# Altium footprint library Connectors.PcbLib: 135 footprints (part 7 of 9)
Each footprint in its own frame and in the unit in brackets; x right, y up, seen from the top. Pads: shape width x height; smd on the part's side, far side on the other; paste and mask are expansions set on the pad; w line width, h text height; cw(c..) or ccw(c..) is an arc to the next point about the centre after c.
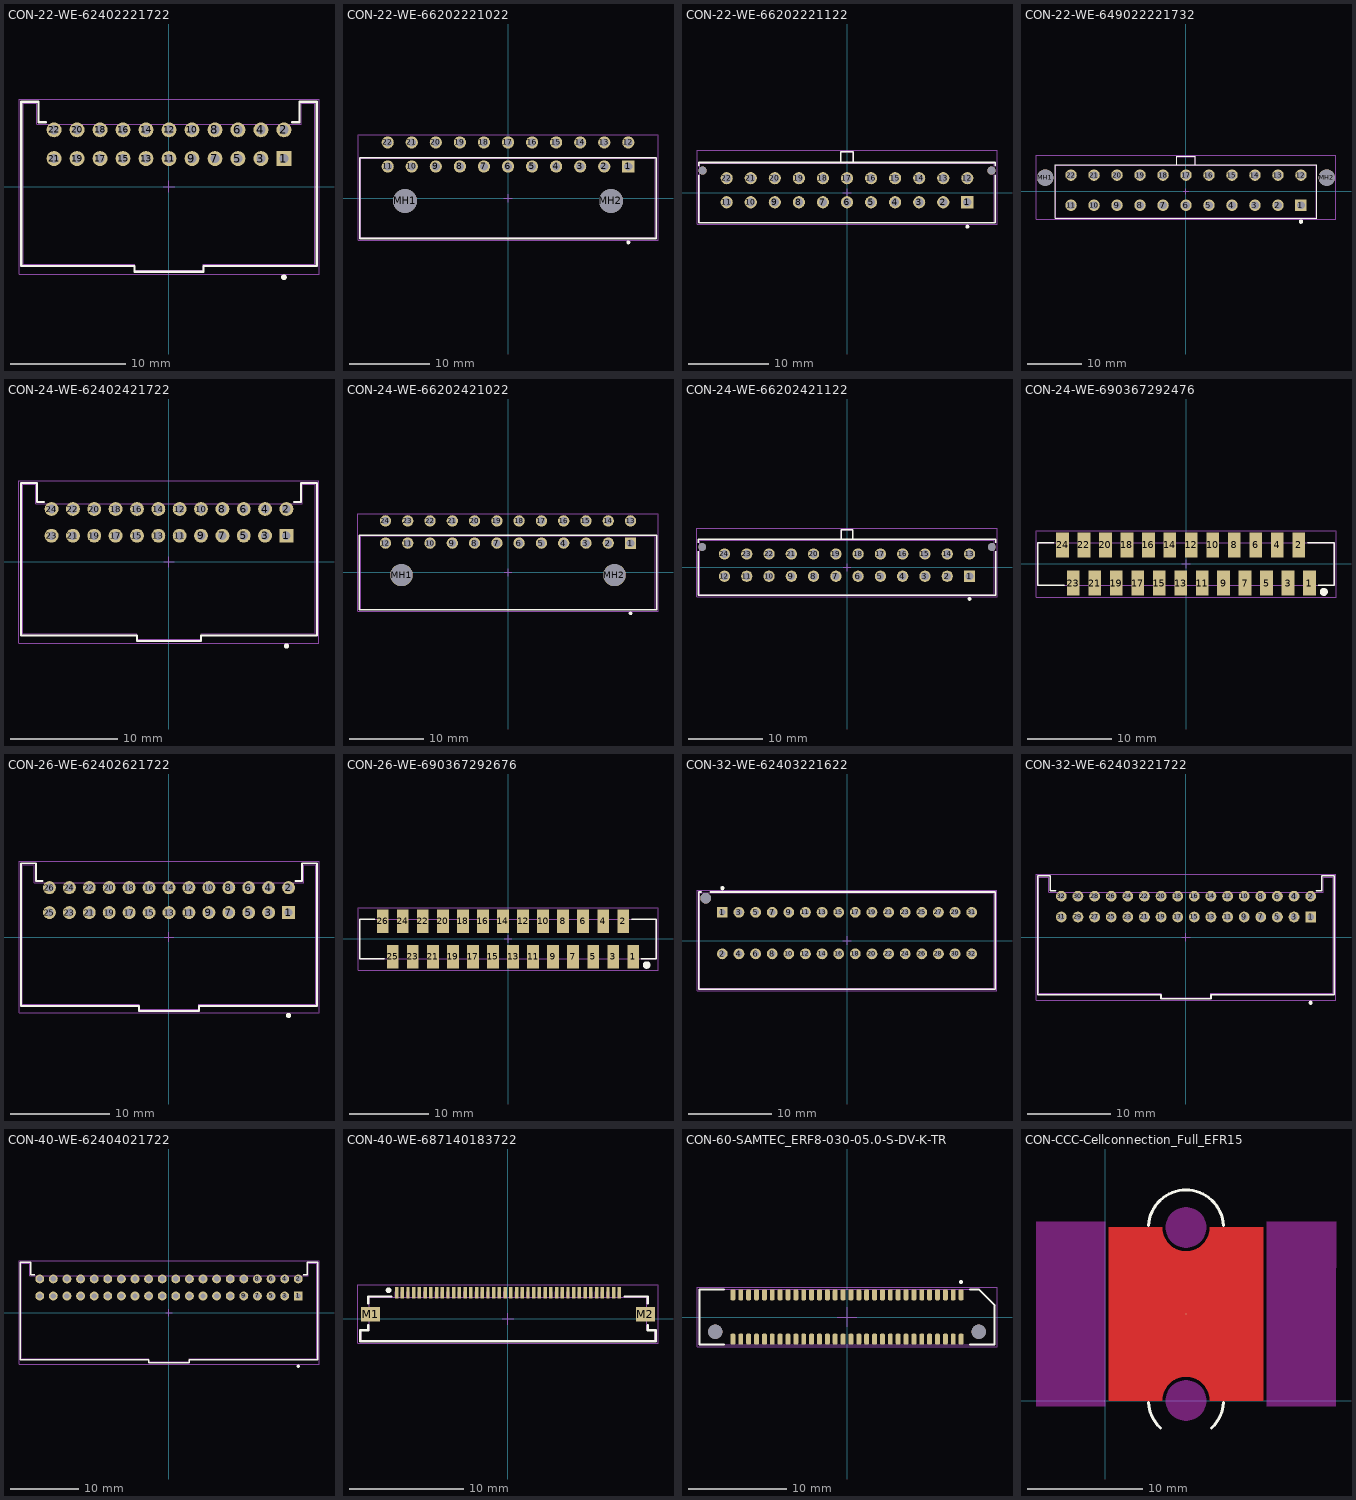
[diagram p6: the footprints below, top view; thin cyan lines are the x and y axes]

## CON-22-WE-62402221722 [mm] "2.00mm Male Dual Row Horizontal Shrouded Header with positive locking, 22p"
height 11.7
pads (22):
  rect 1.3x1.3 hole 0.8: 1(10,2.45)
  round 1.3 hole 0.8: 2(10,4.95) 3(8,2.45) 4(8,4.95) 5(6,2.45) 6(6,4.95) 7(4,2.45) 8(4,4.95) 9(2,2.45) 10(2,4.95) 11(0,2.45) 12(0,4.95) 13(-2,2.45) 14(-2,4.95) 15(-4,2.45) 16(-4,4.95) 17(-6,2.45) 18(-6,4.95) 19(-8,2.45) 20(-8,4.95) 21(-10,2.45) 22(-10,4.95)
Top Overlay:
  circle w0.25: c10,-7.875 r0.125
  lines w0.2: -10.7,5.6 -11.35,5.6 -11.35,7.4 -12.85,7.4 -12.85,-6.9 -3,-6.9 -3,-7.4 3,-7.4 3,-6.9 12.85,-6.9 12.85,7.4 11.35,7.4 11.35,5.6 10.7,5.6
Top Component Center:
  lines w0.05: -0.5,0 0.5,0 ; 0,-0.5 0,0.5
Top Component Outline:
  lines w0.1: -12.7,-6.75 -3,-6.75 -3,-7.25 3,-7.25 3,-6.75 12.7,-6.75 12.7,7.25 11.5,7.25 11.5,5.45 -11.5,5.45 -11.5,7.25 -12.7,7.25 -12.7,-6.75
Top Courtyard (Mech26):
  lines w0.05: -13.05,-7.6 -13.05,7.6 13.05,7.6 13.05,-7.6 -13.05,-7.6
3D body "62402221722.stp": height 11.73, standoff -3.17, extent -12.7,-7.25 12.7,7.25

## CON-22-WE-66202221022 [mm] "Dual row Right angle header With plastic peg 22p"
height 8.76
pads (24):
  rect 1.52x1.52 hole 1.02: 1(15,3.95)
  round 1.52 hole 1.02: 2(12,3.95) 3(9,3.95) 4(6,3.95) 5(3,3.95) 6(0,3.95) 7(-3,3.95) 8(-6,3.95) 9(-9,3.95) 10(-12,3.95) 11(-15,3.95) 12(15,6.95) 13(12,6.95) 14(9,6.95) 15(6,6.95) 16(3,6.95) 17(0,6.95) 18(-3,6.95) 19(-6,6.95) 20(-9,6.95) 21(-12,6.95) 22(-15,6.95)
  round 3 hole 3 unplated: MH1(-12.84,-0.35) MH2(12.84,-0.35)
Top Overlay:
  circle w0.25: c15,-5.5 r0.125
  lines w0.2: -18.5,-5.025 -18.5,5.025 18.5,5.025 18.5,-5.025 -18.5,-5.025
Top Component Center:
  lines w0.05: -0.5,0 0.5,0 ; 0,-0.5 0,0.5 ; -18.7,-5.225 18.7,-5.225 18.7,7.91 -18.7,7.91 -18.7,-5.225
Top Component Outline:
  lines w0.1: -18.35,-4.95 -18.35,4.95 18.35,4.95 18.35,-4.95 -18.35,-4.95
3D body "62002221022.stp": height 8.79, standoff -3.17, extent -18.35,-4.95 18.35,7.27

## CON-22-WE-66202221122 [mm] "Dual row Vertical header 22p"
height 9.9
pads (24):
  rect 1.52x1.52 hole 1.02: 1(15,-1.2)
  round 1.52 hole 1.02: 2(12,-1.2) 3(9,-1.2) 4(6,-1.2) 5(3,-1.2) 6(0,-1.2) 7(-3,-1.2) 8(-6,-1.2) 9(-9,-1.2) 10(-12,-1.2) 11(-15,-1.2) 12(15,1.8) 13(12,1.8) 14(9,1.8) 15(6,1.8) 16(3,1.8) 17(0,1.8) 18(-3,1.8) 19(-6,1.8) 20(-9,1.8) 21(-12,1.8) 22(-15,1.8)
  round 1.02 hole 1.02 unplated: MH1(-18,2.74) MH2(18,2.74)
Top Overlay:
  circle w0.25: c15,-4.25 r0.125
  lines w0.2: -18.5,2.145 -18.5,-3.755 18.5,-3.755 18.5,2.145 ; -18.5,3.345 -18.5,3.755 18.5,3.755 18.5,3.345 ; -0.8,3.755 -0.8,5.08 0.8,5.08 0.8,3.755
Top Component Center:
  lines w0.05: -0.5,0 0.5,0 ; 0,-0.5 0,0.5
Top Component Outline:
  lines w0.1: -0.8,3.68 -0.8,5.08 0.8,5.08 0.8,3.68 ; -18.35,-3.68 18.35,-3.68 18.35,3.68 -18.35,3.68 -18.35,-3.68
Top Courtyard (Mech26):
  lines w0.05: -18.7,-3.955 -18.7,5.28 18.7,5.28 18.7,-3.955 -18.7,-3.955
3D body "66202221122.stp": height 9.93, standoff -3.17, extent -18.35,-3.68 18.35,5.08

## CON-22-WE-649022221732 [mm] "4.20mm Male Dual Row Vertical Header with Mounting Pegs, 22p"
height 12.8
pads (24):
  rect 2.1x2.1 hole 1.4: 1(21,-2.51)
  round 2.1 hole 1.4: 2(16.8,-2.51) 3(12.6,-2.51) 4(8.4,-2.51) 5(4.2,-2.51) 6(0,-2.51) 7(-4.2,-2.51) 8(-8.4,-2.51) 9(-12.6,-2.51) 10(-16.8,-2.51) 11(-21,-2.51) 12(21,2.99) 13(16.8,2.99) 14(12.6,2.99) 15(8.4,2.99) 16(4.2,2.99) 17(0,2.99) 18(-4.2,2.99) 19(-8.4,2.99) 20(-12.6,2.99) 21(-16.8,2.99) 22(-21,2.99)
  round 3 hole 3 unplated: MH1(-25.7,2.53) MH2(25.7,2.53)
Top Overlay:
  circle w0.4: c21,-5.5 r0.2
  lines w0.2: -1.7,4.94 -1.7,6.4 1.7,6.4 1.7,4.94 ; -23.875,-4.9 -23.875,4.9 23.875,4.9 23.875,-4.9 -23.875,-4.9
Top Component Center:
  lines w0.05: -0.5,0 0.5,0 ; 0,-0.5 0,0.5
Top Component Outline:
  lines w0.1: -1.7,4.84 -1.7,6.3 1.7,6.3 1.7,4.84 ; -23.75,-4.8 23.75,-4.8 23.75,4.8 -23.75,4.8 -23.75,-4.8
Top Courtyard (Mech26):
  lines w0.05: -27.4,-5.1 27.4,-5.1 27.4,6.6 -27.4,6.6 -27.4,-5.1
3D body "649022221732.stp": height 12.84, standoff -3.46, extent -26.7,-4.8 26.7,6.3

## CON-24-WE-62402421722 [mm] "2.00mm Male Dual Row Horizontal Shrouded Header with positive locking, 24p"
height 11.7
pads (24):
  rect 1.3x1.3 hole 0.8: 1(11,2.45)
  round 1.3 hole 0.8: 2(11,4.95) 3(9,2.45) 4(9,4.95) 5(7,2.45) 6(7,4.95) 7(5,2.45) 8(5,4.95) 9(3,2.45) 10(3,4.95) 11(1,2.45) 12(1,4.95) 13(-1,2.45) 14(-1,4.95) 15(-3,2.45) 16(-3,4.95) 17(-5,2.45) 18(-5,4.95) 19(-7,2.45) 20(-7,4.95) 21(-9,2.45) 22(-9,4.95) 23(-11,2.45) 24(-11,4.95)
Top Overlay:
  circle w0.25: c11,-7.875 r0.125
  lines w0.2: -11.7,5.6 -12.35,5.6 -12.35,7.4 -13.85,7.4 -13.85,-6.9 -3,-6.9 -3,-7.4 3,-7.4 3,-6.9 13.85,-6.9 13.85,7.4 12.35,7.4 12.35,5.6 11.7,5.6
Top Component Center:
  lines w0.05: -0.5,0 0.5,0 ; 0,-0.5 0,0.5
Top Component Outline:
  lines w0.1: -13.7,-6.75 -13.7,7.25 -12.5,7.25 -12.5,5.45 12.5,5.45 12.5,7.25 13.7,7.25 13.7,-6.75 3,-6.75 3,-7.25 -3,-7.25 -3,-6.75 -13.7,-6.75
Top Courtyard (Mech26):
  lines w0.05: -14.05,-7.6 -14.05,7.6 14.05,7.6 14.05,-7.6 -14.05,-7.6
3D body "62402421722.stp": height 11.73, standoff -3.17, extent -13.7,-7.25 13.7,7.25

## CON-24-WE-66202421022 [mm] "Dual row Right angle header With plastic peg 24p"
height 8.76
pads (26):
  rect 1.52x1.52 hole 1.02: 1(16.5,3.95)
  round 1.52 hole 1.02: 2(13.5,3.95) 3(10.5,3.95) 4(7.5,3.95) 5(4.5,3.95) 6(1.5,3.95) 7(-1.5,3.95) 8(-4.5,3.95) 9(-7.5,3.95) 10(-10.5,3.95) 11(-13.5,3.95) 12(-16.5,3.95) 13(16.5,6.95) 14(13.5,6.95) 15(10.5,6.95) 16(7.5,6.95) 17(4.5,6.95) 18(1.5,6.95) 19(-1.5,6.95) 20(-4.5,6.95) 21(-7.5,6.95) 22(-10.5,6.95) 23(-13.5,6.95) 24(-16.5,6.95)
  round 3 hole 3 unplated: MH1(-14.34,-0.35) MH2(14.34,-0.35)
Top Overlay:
  circle w0.25: c16.5,-5.5 r0.125
  lines w0.2: -20,-5.025 20,-5.025 20,5.025 -20,5.025 -20,-5.025
Top Component Center:
  lines w0.05: -0.5,0 0.5,0 ; 0,-0.5 0,0.5
Top Component Outline:
  lines w0.1: -19.85,-4.95 -19.85,4.95 19.85,4.95 19.85,-4.95 -19.85,-4.95
Top Courtyard (Mech26):
  lines w0.05: -20.2,-5.225 -20.2,7.91 20.2,7.91 20.2,-5.225 -20.2,-5.225
3D body "62002421022.stp": height 8.79, standoff -3.17, extent -19.85,-4.95 19.85,7.27

## CON-24-WE-66202421122 [mm] "Dual row Vertical header 26p"
height 9.9
pads (26):
  rect 1.52x1.52 hole 1.02: 1(16.5,-1.2)
  round 1.52 hole 1.02: 2(13.5,-1.2) 3(10.5,-1.2) 4(7.5,-1.2) 5(4.5,-1.2) 6(1.5,-1.2) 7(-1.5,-1.2) 8(-4.5,-1.2) 9(-7.5,-1.2) 10(-10.5,-1.2) 11(-13.5,-1.2) 12(-16.5,-1.2) 13(16.5,1.8) 14(13.5,1.8) 15(10.5,1.8) 16(7.5,1.8) 17(4.5,1.8) 18(1.5,1.8) 19(-1.5,1.8) 20(-4.5,1.8) 21(-7.5,1.8) 22(-10.5,1.8) 23(-13.5,1.8) 24(-16.5,1.8)
  round 1.02 hole 1.02 unplated: MH1(-19.5,2.74) MH2(19.5,2.74)
Top Overlay:
  circle w0.25: c16.5,-4.25 r0.125
  lines w0.2: -20,2.145 -20,-3.755 20,-3.755 20,2.145 ; -20,3.345 -20,3.755 20,3.755 20,3.345 ; -0.8,3.755 -0.8,5.08 0.8,5.08 0.8,3.755
Top Component Center:
  lines w0.05: -0.5,0 0.5,0 ; 0,-0.5 0,0.5
Top Component Outline:
  lines w0.1: -0.8,3.68 -0.8,5.08 0.8,5.08 0.8,3.68 ; -19.85,-3.68 19.85,-3.68 19.85,3.68 -19.85,3.68 -19.85,-3.68
Top Courtyard (Mech26):
  lines w0.05: -20.2,-3.955 -20.2,5.28 20.2,5.28 20.2,-3.955 -20.2,-3.955
3D body "66202421122.stp": height 9.93, standoff -3.17, extent -19.85,-3.68 19.85,5.08

## CON-24-WE-690367292476 [mm] "MiniModule Connectors, PCB Type, Female, SMT, Vertical, 24p"
height 5.45
pads (24):
  rect 1.5x3 smd: 1(14.605,-2.25) 2(13.335,2.25) 3(12.065,-2.25) 4(10.795,2.25) 5(9.525,-2.25) 6(8.255,2.25) 7(6.985,-2.25) 8(5.715,2.25) 9(4.445,-2.25) 10(3.175,2.25) 11(1.905,-2.25) 12(0.635,2.25) 13(-0.635,-2.25) 14(-1.905,2.25) 15(-3.175,-2.25) 16(-4.445,2.25) 17(-5.715,-2.25) 18(-6.985,2.25) 19(-8.255,-2.25) 20(-9.525,2.25) 21(-10.795,-2.25) 22(-12.065,2.25) 23(-13.335,-2.25) 24(-14.605,2.25)
Top Overlay:
  circle w0.5: c16.3,-3.3 r0.224
  lines w0.2: -15.65,2.5 -17.54,2.5 -17.54,-2.5 -14.4,-2.5 ; 14.4,2.5 17.54,2.5 17.54,-2.5 15.65,-2.5
Top Component Center:
  lines w0.05: -0.5,0 0.5,0 ; 0,-0.5 0,0.5
Top Component Outline:
  lines w0.1: -17.54,-2.5 17.54,-2.5 17.54,2.5 -17.54,2.5 -17.54,-2.5
Top Courtyard (Mech26):
  lines w0.05: -17.74,-3.95 -17.74,3.95 17.74,3.95 17.74,-3.95 -17.74,-3.95
3D body "690367292476.stp": height 5.75, standoff 0, extent -17.535,-3.498 17.535,3.499

## CON-26-WE-62402621722 [mm] "2.00mm Male Dual Row Horizontal Shrouded Header with positive locking, 26p"
height 11.7
pads (26):
  rect 1.3x1.3 hole 0.8: 1(12,2.45)
  round 1.3 hole 0.8: 2(12,4.95) 3(10,2.45) 4(10,4.95) 5(8,2.45) 6(8,4.95) 7(6,2.45) 8(6,4.95) 9(4,2.45) 10(4,4.95) 11(2,2.45) 12(2,4.95) 13(0,2.45) 14(0,4.95) 15(-2,2.45) 16(-2,4.95) 17(-4,2.45) 18(-4,4.95) 19(-6,2.45) 20(-6,4.95) 21(-8,2.45) 22(-8,4.95) 23(-10,2.45) 24(-10,4.95) 25(-12,2.45) 26(-12,4.95)
Top Overlay:
  circle w0.25: c12,-7.875 r0.125
  lines w0.2: -12.7,5.6 -13.35,5.6 -13.35,7.4 -14.85,7.4 -14.85,-6.9 -3,-6.9 -3,-7.4 3,-7.4 3,-6.9 14.85,-6.9 14.85,7.4 13.35,7.4 13.35,5.6 12.7,5.6
Top Component Center:
  lines w0.05: -0.5,0 0.5,0 ; 0,-0.5 0,0.5
Top Component Outline:
  lines w0.1: -14.7,-6.75 -3,-6.75 -3,-7.25 3,-7.25 3,-6.75 14.7,-6.75 14.7,7.25 13.5,7.25 13.5,5.45 -13.5,5.45 -13.5,7.25 -14.7,7.25 -14.7,-6.75
Top Courtyard (Mech26):
  lines w0.05: -15.05,-7.6 15.05,-7.6 15.05,7.6 -15.05,7.6 -15.05,-7.6
3D body "62402621722.stp": height 11.73, standoff -3.17, extent -14.7,-7.25 14.7,7.25

## CON-26-WE-690367292676 [mm] "MiniModule Connectors, PCB Type, Female, SMT, Vertical, 26p"
height 5.45
pads (26):
  rect 1.5x3 smd: 1(15.875,-2.25) 2(14.605,2.25) 3(13.335,-2.25) 4(12.065,2.25) 5(10.795,-2.25) 6(9.525,2.25) 7(8.255,-2.25) 8(6.985,2.25) 9(5.715,-2.25) 10(4.445,2.25) 11(3.175,-2.25) 12(1.905,2.25) 13(0.635,-2.25) 14(-0.635,2.25) 15(-1.905,-2.25) 16(-3.175,2.25) 17(-4.445,-2.25) 18(-5.715,2.25) 19(-6.985,-2.25) 20(-8.255,2.25) 21(-9.525,-2.25) 22(-10.795,2.25) 23(-12.065,-2.25) 24(-13.335,2.25) 25(-14.605,-2.25) 26(-15.875,2.25)
Top Overlay:
  circle w0.5: c17.57,-3.3 r0.224
  lines w0.2: -16.92,2.5 -18.81,2.5 -18.81,-2.5 -15.67,-2.5 ; 15.67,2.5 18.81,2.5 18.81,-2.5 16.92,-2.5
Top Component Center:
  lines w0.05: -0.5,0 0.5,0 ; 0,-0.5 0,0.5
Top Component Outline:
  lines w0.1: -18.81,-2.5 18.81,-2.5 18.81,2.5 -18.81,2.5 -18.81,-2.5
Top Courtyard (Mech26):
  lines w0.05: -19.01,-3.95 -19.01,3.95 19.01,3.95 19.01,-3.95 -19.01,-3.95
3D body "690367292676.stp": height 5.75, standoff 0, extent -18.805,-3.498 18.805,3.499

## CON-32-WE-62403221622 [mm] "2.00mm Male Dual Row Vertical Shrouded Header with positive locking, 32p"
height 11.6
pads (33):
  rect 1.3x1.3 hole 0.8: 1(-15,3.4)
  round 1.3 hole 0.8: 2(-15,-1.6) 3(-13,3.4) 4(-13,-1.6) 5(-11,3.4) 6(-11,-1.6) 7(-9,3.4) 8(-9,-1.6) 9(-7,3.4) 10(-7,-1.6) 11(-5,3.4) 12(-5,-1.6) 13(-3,3.4) 14(-3,-1.6) 15(-1,3.4) 16(-1,-1.6) 17(1,3.4) 18(1,-1.6) 19(3,3.4) 20(3,-1.6) 21(5,3.4) 22(5,-1.6) 23(7,3.4) 24(7,-1.6) 25(9,3.4) 26(9,-1.6) 27(11,3.4) 28(11,-1.6) 29(13,3.4) 30(13,-1.6) 31(15,3.4) 32(15,-1.6)
  round 1.3 hole 1.3 unplated: MH1(-17,5.1)
Top Overlay:
  circle w0.25: c-15,6.3 r0.125
  lines w0.2: -17.55,5.85 -17.85,5.85 -17.85,-5.85 17.85,-5.85 17.85,5.85 -16.45,5.85
Top Component Center:
  lines w0.05: -0.5,0 0.5,0 ; 0,-0.5 0,0.5
Top Component Outline:
  lines w0.1: -17.7,-5.75 17.7,-5.75 17.7,5.75 -17.7,5.75 ; -17.7,-5.75 -17.7,5.75 ; -17.7,-5.75 -17.7,5.75
Top Courtyard (Mech26):
  lines w0.05: -18.05,-6.05 -18.05,6.05 18.05,6.05 18.05,-6.05 -18.05,-6.05
3D body "62403221622.stp": height 9.78, standoff -3.17, extent -17.7,-5.75 17.7,5.75

## CON-32-WE-62403221722 [mm] "2.00mm Male Dual Row Horizontal Shrouded Header with positive locking, 32p"
height 11.7
pads (32):
  rect 1.3x1.3 hole 0.8: 1(15,2.45)
  round 1.3 hole 0.8: 2(15,4.95) 3(13,2.45) 4(13,4.95) 5(11,2.45) 6(11,4.95) 7(9,2.45) 8(9,4.95) 9(7,2.45) 10(7,4.95) 11(5,2.45) 12(5,4.95) 13(3,2.45) 14(3,4.95) 15(1,2.45) 16(1,4.95) 17(-1,2.45) 18(-1,4.95) 19(-3,2.45) 20(-3,4.95) 21(-5,2.45) 22(-5,4.95) 23(-7,2.45) 24(-7,4.95) 25(-9,2.45) 26(-9,4.95) 27(-11,2.45) 28(-11,4.95) 29(-13,2.45) 30(-13,4.95) 31(-15,2.45) 32(-15,4.95)
Top Overlay:
  circle w0.25: c15,-7.875 r0.125
  lines w0.2: -15.7,5.6 -16.35,5.6 -16.35,7.4 -17.85,7.4 -17.85,-6.9 -3,-6.9 -3,-7.4 3,-7.4 3,-6.9 17.85,-6.9 17.85,7.4 16.35,7.4 16.35,5.6 15.7,5.6
Top Component Center:
  lines w0.05: -0.5,0 0.5,0 ; 0,-0.5 0,0.5
Top Component Outline:
  lines w0.1: -17.7,-6.75 -17.7,7.25 -16.5,7.25 -16.5,5.45 16.5,5.45 16.5,7.25 17.7,7.25 17.7,-6.75 3,-6.75 3,-7.25 -3,-7.25 -3,-6.75 -17.7,-6.75
Top Courtyard (Mech26):
  lines w0.05: -18.05,-7.6 -18.05,7.6 18.05,7.6 18.05,-7.6 -18.05,-7.6
3D body "62403221722.stp": height 11.73, standoff -3.17, extent -17.7,-7.25 17.7,7.25

## CON-40-WE-62404021722 [mm] "2.00mm Male Dual Row Horizontal Shrouded Header with positive locking, 40p"
height 11.7
pads (40):
  rect 1.3x1.3 hole 0.8: 1(19,2.45)
  round 1.3 hole 0.8: 2(19,4.95) 3(17,2.45) 4(17,4.95) 5(15,2.45) 6(15,4.95) 7(13,2.45) 8(13,4.95) 9(11,2.45) 10(11,4.95) 11(9,2.45) 12(9,4.95) 13(7,2.45) 14(7,4.95) 15(5,2.45) 16(5,4.95) 17(3,2.45) 18(3,4.95) 19(1,2.45) 20(1,4.95) 21(-1,2.45) 22(-1,4.95) 23(-3,2.45) 24(-3,4.95) 25(-5,2.45) 26(-5,4.95) 27(-7,2.45) 28(-7,4.95) 29(-9,2.45) 30(-9,4.95) 31(-11,2.45) 32(-11,4.95) 33(-13,2.45) 34(-13,4.95) 35(-15,2.45) 36(-15,4.95) 37(-17,2.45) 38(-17,4.95) 39(-19,2.45) 40(-19,4.95)
Top Overlay:
  circle w0.25: c19,-7.875 r0.125
  lines w0.2: -19.7,5.6 -20.35,5.6 -20.35,7.4 -21.85,7.4 -21.85,-6.9 -3,-6.9 -3,-7.4 3,-7.4 3,-6.9 21.85,-6.9 21.85,7.4 20.35,7.4 20.35,5.6 19.7,5.6
Bottom Courtyard (Mech15):
  lines w0.05: -0.5,0 0.5,0 ; 0,-0.5 0,0.5
Top Component Outline:
  lines w0.1: -21.7,-6.75 -21.7,7.25 -20.5,7.25 -20.5,5.45 20.5,5.45 20.5,7.25 21.7,7.25 21.7,-6.75 3,-6.75 3,-7.25 -3,-7.25 -3,-6.75 -21.7,-6.75
Top Courtyard (Mech26):
  lines w0.05: -22.05,-7.6 -22.05,7.6 22.05,7.6 22.05,-7.6 -22.05,-7.6
3D body "62404021722.stp": height 11.73, standoff -3.17, extent -21.7,-7.25 21.7,7.25

## CON-40-WE-687140183722 [mm] "ZIF Connectors, Horizontal, Bottom Contact Low Profile, pitch 0.5mm, 40p"
height 1.3
pads (42):
  rect 0.3x1 smd mask+0: 1(-9.75,2.3) 2(-9.25,2.3) 3(-8.75,2.3) 4(-8.25,2.3) 5(-7.75,2.3) 6(-7.25,2.3) 7(-6.75,2.3) 8(-6.25,2.3) 9(-5.75,2.3) 10(-5.25,2.3) 11(-4.75,2.3) 12(-4.25,2.3) 13(-3.75,2.3) 14(-3.25,2.3) 15(-2.75,2.3) 16(-2.25,2.3) 17(-1.75,2.3) 18(-1.25,2.3) 19(-0.75,2.3) 20(-0.25,2.3) 21(0.25,2.3) 22(0.75,2.3) 23(1.25,2.3) 24(1.75,2.3) 25(2.25,2.3) 26(2.75,2.3) 27(3.25,2.3) 28(3.75,2.3) 29(4.25,2.3) 30(4.75,2.3) 31(5.25,2.3) 32(5.75,2.3) 33(6.25,2.3) 34(6.75,2.3) 35(7.25,2.3) 36(7.75,2.3) 37(8.25,2.3) 38(8.75,2.3) 39(9.25,2.3) 40(9.75,2.3)
  rect 1.65x1.3 smd mask+0: M1(-12.025,0.4) M2(12.025,0.4)
Top Overlay:
  circle w0.25: c-10.45,2.5 r0.125
  lines w0.2: -12.225,-0.55 -12.225,-1 -12.925,-1 -12.925,-1.95 12.925,-1.95 12.925,-1 12.225,-1 12.225,-0.55 ; -12.225,1.35 -12.225,1.95 -10.225,1.95 ; 10.225,1.95 12.225,1.95 12.225,1.35
Top Component Center:
  lines w0.05: -0.5,0 0.5,0 ; 0,-0.5 0,0.5
Top Component Outline:
  lines w0.1: -9.85,1.9 -9.85,2.35 -9.65,2.35 -9.65,1.9 ; -9.35,1.9 -9.35,2.35 -9.15,2.35 -9.15,1.9 ; -8.85,1.9 -8.85,2.35 -8.65,2.35 -8.65,1.9 ; -8.35,1.9 -8.35,2.35 -8.15,2.35 -8.15,1.9 ; -7.85,1.9 -7.85,2.35 -7.65,2.35 -7.65,1.9 ; -7.35,1.9 -7.35,2.35 -7.15,2.35 -7.15,1.9 ; -6.85,1.9 -6.85,2.35 -6.65,2.35 -6.65,1.9 ; -6.35,1.9 -6.35,2.35 -6.15,2.35 -6.15,1.9 ; -5.85,1.9 -5.85,2.35 -5.65,2.35 -5.65,1.9 ; -5.35,1.9 -5.35,2.35 -5.15,2.35 -5.15,1.9 ; -4.85,1.9 -4.85,2.35 -4.65,2.35 -4.65,1.9 ; -4.35,1.9 -4.35,2.35 -4.15,2.35 -4.15,1.9 ; -3.85,1.9 -3.85,2.35 -3.65,2.35 -3.65,1.9 ; -3.35,1.9 -3.35,2.35 -3.15,2.35 -3.15,1.9 ; -2.85,1.9 -2.85,2.35 -2.65,2.35 -2.65,1.9 ; -2.35,1.9 -2.35,2.35 -2.15,2.35 -2.15,1.9 ; -1.85,1.9 -1.85,2.35 -1.65,2.35 -1.65,1.9 ; -1.35,1.9 -1.35,2.35 -1.15,2.35 -1.15,1.9 ; -0.85,1.9 -0.85,2.35 -0.65,2.35 -0.65,1.9 ; -0.35,1.9 -0.35,2.35 -0.15,2.35 -0.15,1.9 ; 0.15,1.9 0.15,2.35 0.35,2.35 0.35,1.9 ; 0.65,1.9 0.65,2.35 0.85,2.35 0.85,1.9 ; 1.15,1.9 1.15,2.35 1.35,2.35 1.35,1.9 ; 1.65,1.9 1.65,2.35 1.85,2.35 1.85,1.9 ; 2.15,1.9 2.15,2.35 2.35,2.35 2.35,1.9 ; 2.65,1.9 2.65,2.35 2.85,2.35 2.85,1.9 ; 3.15,1.9 3.15,2.35 3.35,2.35 3.35,1.9 ; 3.65,1.9 3.65,2.35 3.85,2.35 3.85,1.9 ; 4.15,1.9 4.15,2.35 4.35,2.35 4.35,1.9 ; 4.65,1.9 4.65,2.35 4.85,2.35 4.85,1.9 ; 5.15,1.9 5.15,2.35 5.35,2.35 5.35,1.9 ; 5.65,1.9 5.65,2.35 5.85,2.35 5.85,1.9 ; 6.15,1.9 6.15,2.35 6.35,2.35 6.35,1.9 ; 6.65,1.9 6.65,2.35 6.85,2.35 6.85,1.9 ; 7.15,1.9 7.15,2.35 7.35,2.35 7.35,1.9 ; 7.65,1.9 7.65,2.35 7.85,2.35 7.85,1.9 ; 8.15,1.9 8.15,2.35 8.35,2.35 8.35,1.9 ; 8.65,1.9 8.65,2.35 8.85,2.35 8.85,1.9 ; 9.15,1.9 9.15,2.35 9.35,2.35 9.35,1.9 ; 9.65,1.9 9.65,2.35 9.85,2.35 9.85,1.9 ; -12.85,-1.9 -12.85,-1 -12.15,-1 -12.15,1.9 12.15,1.9 12.15,-1 12.85,-1 12.85,-1.9 -12.85,-1.9
Top Courtyard (Mech26):
  lines w0.05: -13.125,-2.15 -13.125,3 13.125,3 13.125,-2.15 -13.125,-2.15
Top Designator:
  text ".Designator" at -7.498,-0.5 h1.5
3D body "687140183722.stp": height 1.28, standoff -0.01, extent -12.85,-1.9 12.85,2.35

## CON-60-SAMTEC_ERF8-030-05.0-S-DV-K-TR [mm] "Samtec Edge Rate® ERF8-Series Rugged High Speed Socket 0.80mm"
pads (62):
  rrect50% 0.5x1.1 smd mask+0.045: 01(11.6,2.25) 02(11.6,-2.25) 03(10.8,2.25) 04(10.8,-2.25) 05(10,2.25) 06(10,-2.25) 07(9.2,2.25) 08(9.2,-2.25) 09(8.4,2.25) 10(8.4,-2.25) 11(7.6,2.25) 12(7.6,-2.25) 13(6.8,2.25) 14(6.8,-2.25) 15(6,2.25) 16(6,-2.25) 17(5.2,2.25) 18(5.2,-2.25) 19(4.4,2.25) 20(4.4,-2.25) 21(3.6,2.25) 22(3.6,-2.25) 23(2.8,2.25) 24(2.8,-2.25) 25(2,2.25) 26(2,-2.25) 27(1.2,2.25) 28(1.2,-2.25) 29(0.4,2.25) 30(0.4,-2.25) 31(-0.4,2.25) 32(-0.4,-2.25) 33(-1.2,2.25) 34(-1.2,-2.25) 35(-2,2.25) 36(-2,-2.25) 37(-2.8,2.25) 38(-2.8,-2.25) 39(-3.6,2.25) 40(-3.6,-2.25) 41(-4.4,2.25) 42(-4.4,-2.25) 43(-5.2,2.25) 44(-5.2,-2.25) 45(-6,2.25) 46(-6,-2.25) 47(-6.8,2.25) 48(-6.8,-2.25) 49(-7.6,2.25) 50(-7.6,-2.25) 51(-8.4,2.25) 52(-8.4,-2.25) 53(-9.2,2.25) 54(-9.2,-2.25) 55(-10,2.25) 56(-10,-2.25) 57(-10.8,2.25) 58(-10.8,-2.25) 59(-11.6,2.25) 60(-11.6,-2.25)
  round 1.45 hole 1.45 unplated mask+0: ""(-13.4,-1.5) ""(13.4,-1.5)
Top Overlay:
  circle w0.2: c11.6,3.56 r0.1
  lines w0.2: -12.5,-2.8 -15,-2.8 -15,2.8 -12.5,2.8 ; 12.5,-2.8 15,-2.8 15,1.2 13.4,2.8 12.5,2.8
Top Component Center:
  lines w0.1: -1,0 1,0 ; 0,-1 0,1
Top Component Outline:
  circle w0.2: c11.6,3.56 r0.1
  lines w0.1: -15,-2.8 -15,2.8 13.4,2.8 15,1.2 15,-2.8 -15,-2.8
Top Courtyard (Mech26):
  lines w0.05: -15.25,-3.05 -15.25,3.05 15.25,3.05 15.25,-3.05 -15.25,-3.05
3D body "ERF8-030-05.0-S-DV-K-TR.stp": height 5.29, standoff -1.28, extent -15,-3 15,2.988

## CON-CCC-Cellconnection_Full_EFR15 [mm]
pads (1):
  round 0.025 smd mask+0: 1(7,7.5)
Top Layer:
  region: 13.701,0 9.056,0 9.05,0.232 8.983,0.57 8.971,0.598 8.965,0.628 8.833,0.946 8.817,0.971 8.805,0.999 8.614,1.285 8.592,1.307 8.576,1.332 8.332,1.576 8.307,1.592 8.285,1.614 7.999,1.805 7.971,1.817 7.946,1.833 7.628,1.965 7.598,1.971 7.57,1.983 7.232,2.05 7.202,2.05 7.172,2.056 6.828,2.056 6.798,2.05 6.768,2.05 6.43,1.983 6.402,1.971 6.372,1.965 6.054,1.833 6.029,1.817 6.001,1.805 5.715,1.614 5.693,1.592 5.668,1.576 5.424,1.332 5.408,1.307 5.386,1.285 5.195,0.999 5.183,0.971 5.167,0.946 5.035,0.628 5.029,0.598 5.017,0.57 4.95,0.232 4.95,0.202 4.944,0.172 4.944,0 0.306,0 0.306,15 4.944,15 4.944,14.828 4.95,14.798 4.95,14.768 5.017,14.43 5.029,14.402 5.035,14.372 5.167,14.054 5.183,14.029 5.195,14.001 5.386,13.715 5.408,13.693 5.424,13.668 5.668,13.424 5.693,13.408 5.715,13.386 6.001,13.195 6.029,13.183 6.054,13.167 6.372,13.035 6.402,13.029 6.43,13.017 6.768,12.95 6.798,12.95 6.828,12.944 7.172,12.944 7.202,12.95 7.232,12.95 7.57,13.017 7.598,13.029 7.628,13.035 7.946,13.167 7.971,13.183 7.999,13.195 8.285,13.386 8.307,13.408 8.332,13.424 8.576,13.668 8.592,13.693 8.614,13.714 8.805,14.001 8.817,14.029 8.833,14.054 8.965,14.372 8.971,14.402 8.983,14.43 9.05,14.768 9.05,14.798 9.056,14.828 9.056,15 13.694,15
Top Overlay:
  lines w0.254: 3.754,-0.17 ccw(c7,0) 4.784,-2.377 ; 3.754,15.17 cw(c7,15) 10.246,15.17 ; 9.216,-2.377 ccw(c7,0) 10.246,-0.17
Bottom Overlay:
  circle w0.254: c7,15 r3.25
  lines w0.254: 4.784,-2.377 cw(c7,0) 9.216,-2.377
Keep-Out Layer:
  board cut-out: 7,1.75 6.828,1.75 6.49,1.683 6.171,1.551 5.884,1.359 5.641,1.116 5.449,0.829 5.317,0.51 5.25,0.172 5.25,0 5.25,-0.172 5.317,-0.51 5.449,-0.829 5.641,-1.116 5.884,-1.359 6.171,-1.551 6.49,-1.683 6.828,-1.75 7,-1.75 7.172,-1.75 7.51,-1.683 7.829,-1.551 8.116,-1.359 8.359,-1.116 8.551,-0.829 8.683,-0.51 8.75,-0.172 8.75,0 8.75,0.172 8.683,0.51 8.551,0.829 8.359,1.116 8.116,1.359 7.829,1.551 7.51,1.683 7.172,1.75
  board cut-out: 7,16.75 6.828,16.75 6.49,16.683 6.171,16.551 5.884,16.359 5.641,16.116 5.449,15.829 5.317,15.51 5.25,15.172 5.25,15 5.25,14.828 5.317,14.49 5.449,14.171 5.641,13.884 5.884,13.641 6.171,13.449 6.49,13.317 6.828,13.25 7,13.25 7.172,13.25 7.51,13.317 7.829,13.449 8.116,13.641 8.359,13.884 8.551,14.171 8.683,14.49 8.75,14.828 8.75,15 8.75,15.172 8.683,15.51 8.551,15.829 8.359,16.116 8.116,16.359 7.829,16.551 7.51,16.683 7.172,16.75
  board cut-out: 20,7.483 20,-0.5 14,-0.5 14,15.5 20,15.5
  board cut-out: 0,7.483 0,-0.5 -6,-0.5 -6,15.5 0,15.5